# Altium footprint library ICs And Semiconductors THD.PcbLib: 507 footprints (part 14 of 32)
Each footprint in its own frame and in the unit in brackets; x right, y up, seen from the top. Pads: shape width x height; smd on the part's side, far side on the other; paste and mask are expansions set on the pad; w line width, h text height; cw(c..) or ccw(c..) is an arc to the next point about the centre after c.
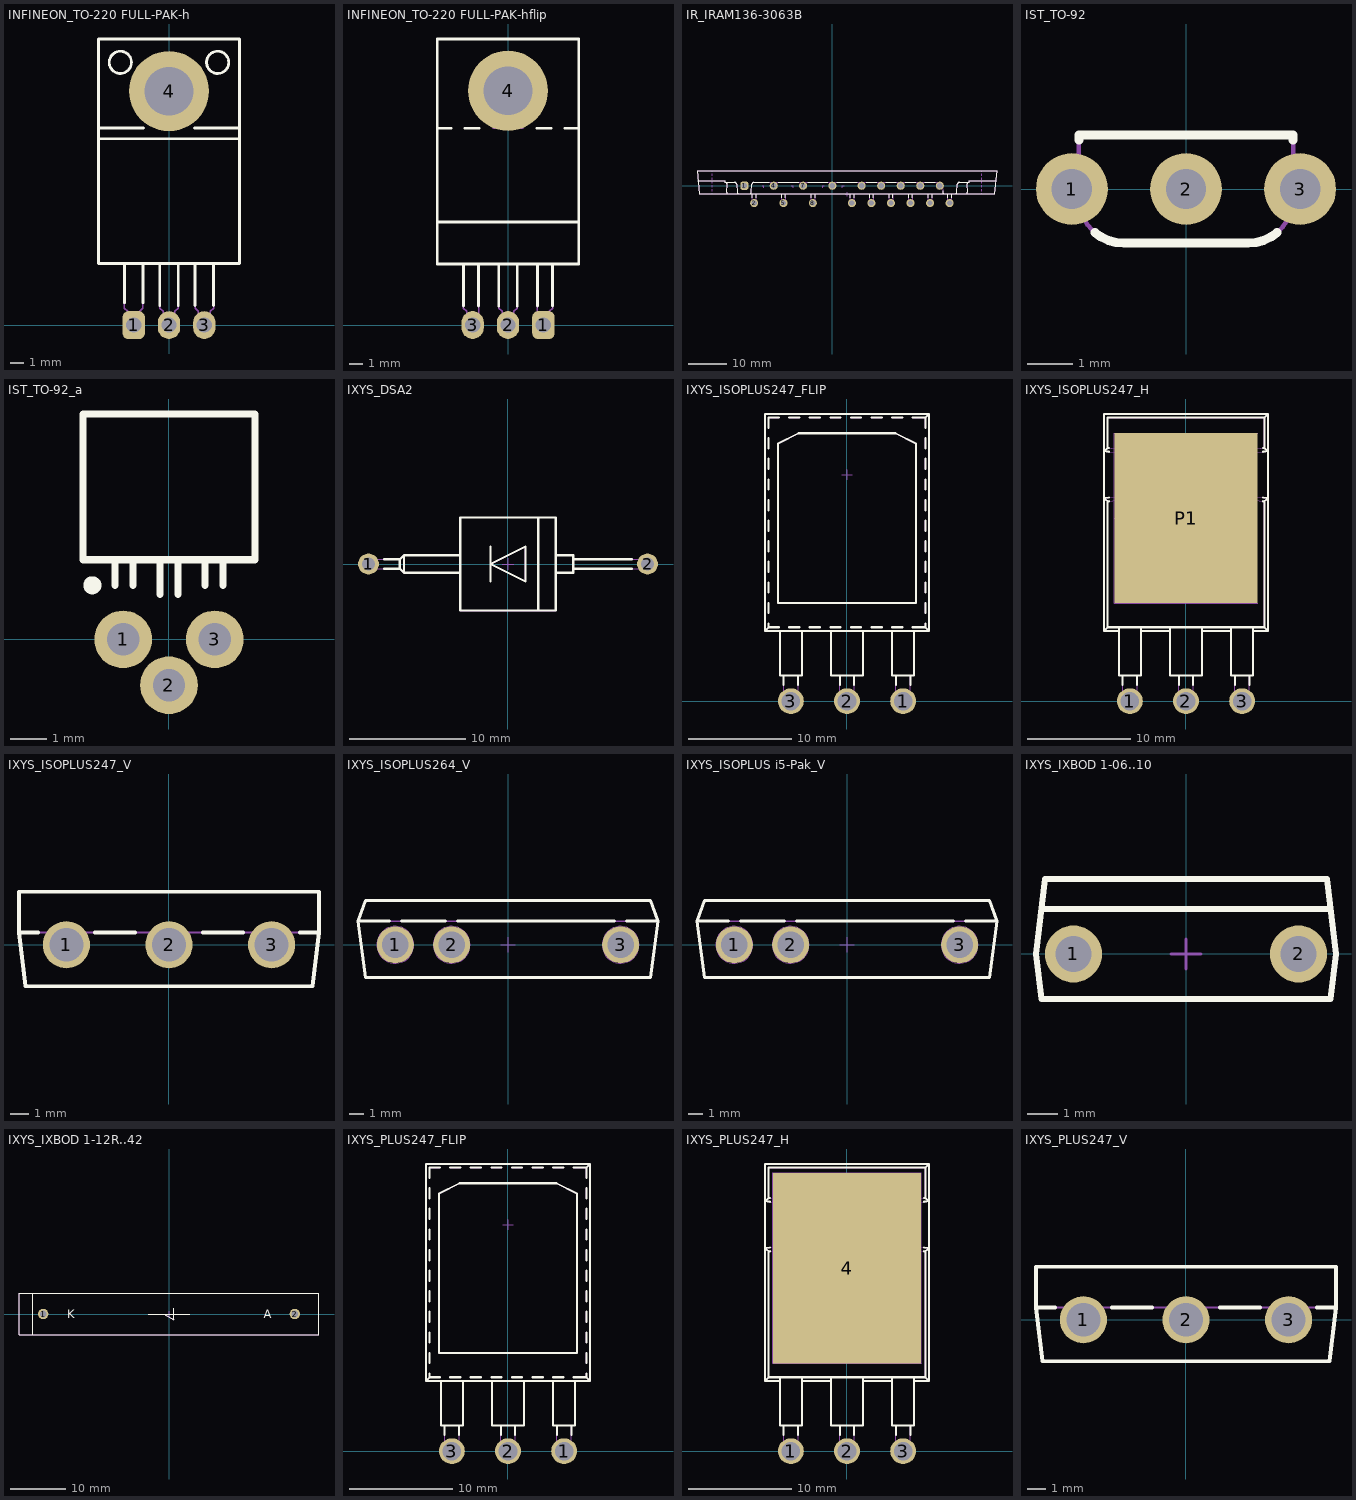
[diagram p13: the footprints below, top view; thin cyan lines are the x and y axes]

## INFINEON_TO-220 FULL-PAK-h [mm] "TO-220 3-Terminal Outline INFINEON/INTERNATIONAL RECTIFIER Full-Pak Package - Horizontal Mount"
height 4.83
pads (4):
  rrect50% 1.6x2 hole 1.1: 1(-2.54,0)
  oval 1.6x2 hole 1.1: 2(0,0) 3(2.54,0)
  round 5.75 hole 3.5: 4(0,16.828)
Top Overlay:
  circle w0.2: c3.5,18.9 r0.8
  circle w0.2: c-3.5,18.9 r0.8
  lines w0.2: -5.08,13.407 5.08,13.407 ; -5.08,14.172 -1.827,14.172 ; -3.205,1.6 -3.205,4.43 ; -1.875,1.6 -1.875,4.43 ; -0.665,1.4 -0.665,4.43 ; 0.665,1.4 0.665,4.43 ; 1.827,14.172 5.08,14.172 ; 1.875,1.4 1.875,4.43 ; 3.205,1.4 3.205,4.43 ; -5.08,4.43 -5.08,20.58 5.08,20.58 5.08,4.43 -5.08,4.43
Notvisible:
  lines w0.1: -3.04,0 -2.54,0 ; -2.54,-0.5 -2.54,0 ; -2.54,0.5 -2.54,0 ; -2.04,0 -2.54,0 ; -0.5,0 0,0 ; 0,-0.5 0,0 ; 0,0.5 0,0 ; 0.5,0 0,0 ; 2.04,0 2.54,0 ; 2.54,-0.5 2.54,0 ; 2.54,0.5 2.54,0 ; 3.04,0 2.54,0
Mechanical 14:
  circle w0.1: c0,16.828 r2
  circle w0.1: c3.5,18.9 r0.8
  circle w0.1: c-3.5,18.9 r0.8
  circle w0.1: c0,16.83 r1.6
  lines w0.1: -5.08,13.407 5.08,13.407 ; -5.08,14.172 -1.827,14.172 ; -3.205,4.43 -3.205,1.22 -2.965,0.98 -2.965,-0.315 -2.115,-0.315 -2.115,0.98 -1.875,1.22 -1.875,4.43 ; -0.665,4.43 -0.665,1.22 -0.425,0.98 -0.425,-0.315 0.425,-0.315 0.425,0.98 0.665,1.22 0.665,4.43 ; 1.827,14.172 5.08,14.172 ; 1.875,4.43 1.875,1.22 2.115,0.98 2.115,-0.315 2.965,-0.315 2.965,0.98 3.205,1.22 3.205,4.43 ; -5.08,4.43 -5.08,20.58 5.08,20.58 5.08,4.43 -5.08,4.43
3D body "IR_TO-220 FULL-PAK-h.stp": height 4.85, standoff -3.6, extent -5.08,-0.315 5.08,20.58

## INFINEON_TO-220 FULL-PAK-hflip [mm] "TO-220 3-Terminal Outline INFINEON/INTERNATIONAL RECTIFIER Full-Pak Package - Flipped Horizontal Mount"
height 4.83
pads (4):
  rrect50% 1.6x2 hole 1.1: 1(2.54,0)
  oval 1.6x2 hole 1.1: 2(0,0) 3(-2.54,0)
  round 5.75 hole 3.5: 4(0,16.828)
Top Overlay:
  lines w0.2: -5.08,7.395 5.08,7.395 ; -5.08,14.137 -4.08,14.137 ; -3.205,1.365 -3.205,4.395 ; -3.08,14.137 -2.08,14.137 ; -2.115,1.365 -2.115,4.395 ; -0.665,1.365 -0.665,4.395 ; 0.665,1.365 0.665,4.395 ; 2.08,14.137 3.08,14.137 ; 2.115,1.365 2.115,4.395 ; 3.205,1.365 3.205,4.395 ; 4.08,14.137 5.08,14.137 ; -5.08,4.395 5.08,4.395 5.08,20.545 -5.08,20.545 -5.08,4.395
Notvisible:
  lines w0.1: -3.04,0 -2.54,0 ; -2.54,-0.5 -2.54,0 ; -2.54,0.5 -2.54,0 ; -2.04,0 -2.54,0 ; -0.5,0 0,0 ; -0.5,16.75 0,16.75 ; 0,-0.5 0,0 ; 0,0.5 0,0 ; 0,16.25 0,16.75 ; 0,17.25 0,16.75 ; 0.5,0 0,0 ; 0.5,16.75 0,16.75 ; 2.04,0 2.54,0 ; 2.54,-0.5 2.54,0 ; 2.54,0.5 2.54,0 ; 3.04,0 2.54,0
Mechanical 14:
  circle w0.1: c0,16.795 r1.6
  lines w0.1: -5.08,7.395 5.08,7.395 ; -5.08,14.137 -4.08,14.137 ; -3.205,4.395 -3.205,1.22 -2.965,0.98 -2.965,-0.315 -2.115,-0.315 -2.115,4.395 ; -3.08,14.137 -2.08,14.137 ; -1.08,14.137 1.08,14.137 ; -0.665,4.395 -0.665,1.22 -0.425,0.98 -0.425,-0.315 0.425,-0.315 0.425,0.98 0.665,1.22 0.665,4.395 ; 2.08,14.137 3.08,14.137 ; 2.115,4.395 2.115,-0.315 2.965,-0.315 2.965,0.98 3.205,1.22 3.205,4.395 ; 4.08,14.137 5.08,14.137 ; -5.08,4.395 -5.08,20.545 5.08,20.545 5.08,4.395 -5.08,4.395
3D body "INFINEON_TO-220 FULL-PAK-hflip.stp": height 4.85, standoff -3.6, extent -5.08,-0.315 5.08,20.545

## IR_IRAM136-3063B [mm] "International Rectifier SIP-3 Package Outline"
height 34.1
pads (18):
  rrect50% 2.1x2.1 hole 1.4: 1(-22.86,0)
  round 2.1 hole 1.4: 2(-20.32,-4.5) 4(-15.24,0) 5(-12.7,-4.5) 7(-7.62,0) 8(-5.08,-4.5) 10(0,0) 12(5.08,-4.5) 13(7.62,0) 14(10.16,-4.5) 15(12.7,0) 16(15.24,-4.5) 17(17.78,0) 18(20.32,-4.5) 19(22.86,0) 20(25.4,-4.5) 21(27.94,0) 22(30.48,-4.5)
Top Overlay:
  lines w0.2: -34.962,1.25 -27.963,1.25 -27.928,0.85 -25.386,0.85 cw(c-25.386,0.349) -24.887,0.392 -24.704,-1.695 ccw(c-24.207,-1.651) -24.207,-2.15 -21.573,-2.15 ccw(c-21.573,-1.65) -21.075,-1.694 -20.892,0.394 cw(c-20.394,0.35) -20.394,0.85 -16.415,0.85 ; -27.727,0.85 cw(c-27.788,0.448) -27.385,0.394 -27.497,-1.694 ccw(c-26.946,-1.754) -27.334,-2.15 ; -20.77,-3.122 -20.77,-2.15 ; -19.87,-3.122 -19.87,-2.15 ; -14.065,0.85 -8.795,0.85 ; -13.15,-3.122 -13.15,-2.15 ; -12.25,-3.122 -12.25,-2.15 ; -6.445,0.85 -1.175,0.85 ; -5.53,-3.122 -5.53,-2.15 ; -4.63,-3.122 -4.63,-2.15 ; 1.175,0.85 6.445,0.85 ; 4.63,-3.122 4.63,-2.15 ; 5.53,-3.122 5.53,-2.15 ; 8.795,0.85 11.525,0.85 ; 9.71,-3.122 9.71,-2.15 ; 10.61,-3.122 10.61,-2.15 ; 13.875,0.85 16.605,0.85 ; 14.79,-3.122 14.79,-2.15 ; 15.69,-3.122 15.69,-2.15 ; 18.955,0.85 21.685,0.85 ; 19.87,-3.122 19.87,-2.15 ; 20.77,-3.122 20.77,-2.15 ; 24.035,0.85 26.765,0.85 ; 24.95,-3.122 24.95,-2.15 ; 25.85,-3.122 25.85,-2.15 ; 28.657,-1.26 28.695,-1.694 ccw(c29.193,-1.65) 29.193,-2.15 ; 30.03,-3.122 30.03,-2.15 ; 30.93,-3.122 30.93,-2.15 ; 31.827,-2.15 ccw(c31.827,-1.65) 32.325,-1.694 32.508,0.394 cw(c33.006,0.35) 33.006,0.85 35.548,0.85 35.583,1.25 42.583,1.25 ; 34.954,-2.15 ccw(c34.341,-1.673) 35.117,-1.694 35.005,0.394 cw(c35.538,0.394) 35.262,0.85 ; -35.19,3.85 42.81,3.85 42.285,-2.15 -34.665,-2.15 -35.19,3.85
Notvisible:
  lines w0.1: -31.19,-2.15 -31.19,-1.9 ; -31.19,-1.4 -31.19,-0.9 ; -31.19,-0.4 -31.19,0.1 ; -31.19,0.6 -31.19,1.1 ; -31.19,1.6 -31.19,2.1 ; -31.19,2.6 -31.19,3.1 ; -31.19,3.6 -31.19,3.85 ; -23.36,0 -22.86,0 ; -22.86,-0.5 -22.86,0 ; -22.86,0.5 -22.86,0 ; -22.36,0 -22.86,0 ; -20.82,-4.5 -20.32,-4.5 ; -20.32,-5 -20.32,-4.5 ; -20.32,-4 -20.32,-4.5 ; -19.82,-4.5 -20.32,-4.5 ; -18.28,0 -17.78,0 -17.78,-0.5 ; -15.74,0 -15.24,0 ; -15.24,-0.5 -15.24,0 ; -15.24,0.5 -15.24,0 ; -14.74,0 -15.24,0 ; -13.2,-4.5 -12.7,-4.5 ; -12.7,-5 -12.7,-4.5 ; -12.7,-4 -12.7,-4.5 ; -12.2,-4.5 -12.7,-4.5 ; -10.66,0 -10.16,0 -10.16,-0.5 ; -8.12,0 -7.62,0 ; -7.62,-0.5 -7.62,0 ; -7.62,0.5 -7.62,0 ; -7.12,0 -7.62,0 ; -5.58,-4.5 -5.08,-4.5 ; -5.08,-5 -5.08,-4.5 ; -5.08,-4 -5.08,-4.5 ; -4.58,-4.5 -5.08,-4.5 ; -2.54,-0.5 -2.54,0 -2.04,0 ; -0.5,0 0,0 ; 0,-0.5 0,0 ; 0,0.5 0,0 ; 0.5,0 0,0 ; 2.54,-0.5 2.54,0 3.04,0 ; 3.31,-2.25 3.81,-2.25 ; 3.81,-2.75 3.81,-2.25 ; 3.81,-1.75 3.81,-2.25 ; 4.31,-2.25 3.81,-2.25 ; 4.58,-4.5 5.08,-4.5 ; 5.08,-5 5.08,-4.5 ; 5.08,-4 5.08,-4.5 ; 5.58,-4.5 5.08,-4.5 ; 7.12,0 7.62,0 ; 7.62,-0.5 7.62,0 ; 7.62,0.5 7.62,0 ; 8.12,0 7.62,0 ; 9.66,-4.5 10.16,-4.5 ; 10.16,-5 10.16,-4.5 ; 10.16,-4 10.16,-4.5 ; 10.66,-4.5 10.16,-4.5 ; 12.2,0 12.7,0 ; 12.7,-0.5 12.7,0 ; 12.7,0.5 12.7,0 ; 13.2,0 12.7,0 ; 14.74,-4.5 15.24,-4.5 ; 15.24,-5 15.24,-4.5 ; 15.24,-4 15.24,-4.5 ; 15.74,-4.5 15.24,-4.5 ; 17.28,0 17.78,0 ; 17.78,-0.5 17.78,0 ; 17.78,0.5 17.78,0 ; 18.28,0 17.78,0 ; 19.82,-4.5 20.32,-4.5 ; 20.32,-5 20.32,-4.5 ; 20.32,-4 20.32,-4.5 ; 20.82,-4.5 20.32,-4.5 ; 22.36,0 22.86,0 ; 22.86,-0.5 22.86,0 ; 22.86,0.5 22.86,0 ; 23.36,0 22.86,0 ; 24.9,-4.5 25.4,-4.5 ; 25.4,-5 25.4,-4.5 ; 25.4,-4 25.4,-4.5 ; 25.9,-4.5 25.4,-4.5 ; 27.44,0 27.94,0 ; 27.94,-0.5 27.94,0 ; 27.94,0.5 27.94,0 ; 28.44,0 27.94,0 ; 29.98,-4.5 30.48,-4.5 ; 30.48,-5 30.48,-4.5 ; 30.48,-4 30.48,-4.5 ; 30.98,-4.5 30.48,-4.5 ; 38.81,-2.15 38.81,-1.9 ; 38.81,-1.4 38.81,-0.9 ; 38.81,-0.4 38.81,0.1 ; 38.81,0.6 38.81,1.1 ; 38.81,1.6 38.81,2.1 ; 38.81,2.6 38.81,3.1 ; 38.81,3.6 38.81,3.85
Mechanical 14:
  lines w0.1: -34.962,1.25 -27.963,1.25 -27.928,0.85 -25.386,0.85 cw(c-25.386,0.349) -24.887,0.392 -24.704,-1.695 ccw(c-24.207,-1.651) -24.207,-2.15 -21.573,-2.15 ccw(c-21.573,-1.65) -21.075,-1.694 -20.892,0.394 cw(c-20.394,0.35) -20.394,0.85 28.014,0.85 cw(c28.014,0.35) 28.512,0.394 28.695,-1.694 ccw(c29.193,-1.65) 29.193,-2.15 ; -27.727,0.85 cw(c-27.788,0.448) -27.385,0.394 -27.497,-1.694 ccw(c-26.946,-1.754) -27.334,-2.15 ; -20.77,-2.15 -20.77,-4.85 -19.87,-4.85 -19.87,-2.15 ; -13.15,-2.15 -13.15,-4.85 -12.25,-4.85 -12.25,-2.15 ; -5.53,-2.15 -5.53,-4.85 -4.63,-4.85 -4.63,-2.15 ; 4.63,-2.15 4.63,-4.85 5.53,-4.85 5.53,-2.15 ; 9.71,-2.15 9.71,-4.85 10.61,-4.85 10.61,-2.15 ; 14.79,-2.15 14.79,-4.85 15.69,-4.85 15.69,-2.15 ; 19.87,-2.15 19.87,-4.85 20.77,-4.85 20.77,-2.15 ; 24.95,-2.15 24.95,-4.85 25.85,-4.85 25.85,-2.15 ; 30.03,-2.15 30.03,-4.85 30.93,-4.85 30.93,-2.15 ; 31.827,-2.15 ccw(c31.827,-1.65) 32.325,-1.694 32.508,0.394 cw(c33.006,0.35) 33.006,0.85 35.548,0.85 35.583,1.25 42.583,1.25 ; 34.954,-2.15 ccw(c34.341,-1.673) 35.117,-1.694 35.005,0.394 cw(c35.538,0.394) 35.262,0.85 ; -35.19,3.85 42.81,3.85 42.285,-2.15 -34.665,-2.15 -35.19,3.85
3D body "IR_IRAM136-3063B.stp": height 35.1, standoff -3.3, extent -35.19,-4.85 42.81,3.85

## IST_TO-92 [mm] "TO-92, Pitch 2.54mm, Flat Index, 3 In-Line, Bent Leads, Body 4.57 x 2.285mm"
height 8
pads (3):
  round 1.6 hole 0.9: 1(-2.54,0) 2(0,0) 3(2.54,0)
Top Overlay:
  lines w0.2: -2.385,1.089 -2.385,1.205 2.385,1.205 2.385,1.089 ; -2.026,-0.973 ccw(c-1.385,-0.205) -1.385,-1.205 1.385,-1.205 ccw(c1.385,-0.205) 2.026,-0.973
Notvisible:
  lines w0.1: -3.04,0 -2.54,0 ; -2.54,-0.5 -2.54,0 ; -2.54,0.5 -2.54,0 ; -2.04,0 -2.54,0 ; -0.5,0 0,0 ; 0,-0.5 0,0 ; 0,0.5 0,0 ; 0.5,0 0,0 ; 2.04,0 2.54,0 ; 2.54,-0.5 2.54,0 ; 2.54,0.5 2.54,0 ; 3.04,0 2.54,0
Mechanical 14:
  lines w0.1: -2.385,-0.205 ccw(c-1.385,-0.205) -1.385,-1.205 1.385,-1.205 ccw(c1.385,-0.205) 2.385,-0.205 2.385,1.205 -2.385,1.205 -2.385,-0.205
3D body "IST_TO92.stp": height 8.01, standoff -3.2, extent -2.787,-1.205 2.788,1.205

## IST_TO-92_a [mm] "TO-92, Pitch 2.54mm, Flat Index, 3 In-Line, Bent Leads, Body 4.57 x 2.285mm - Bent on the PCB"
height 2.14
pads (3):
  round 1.6 hole 0.9: 1(-1.27,0) 2(0,-1.27) 3(1.27,0)
Top Overlay:
  circle w0.25: c-2.125,1.5 r0.125
  lines w0.2: -2.385,6.215 -2.385,2.205 ; -2.385,6.25 2.385,6.25 ; -1.498,1.5 -1.498,2.205 ; -1.002,1.5 -1.002,2.205 ; -0.247,1.25 -0.247,2.205 ; 0.248,1.25 0.248,2.205 ; 1.002,1.5 1.002,2.205 ; 1.498,1.5 1.498,2.205 ; 2.385,6.215 2.385,2.205 ; -2.385,2.205 2.385,2.205 ; -2.385,2.205 2.385,2.205
Notvisible:
  lines w0.1: -1.77,0 -1.27,0 ; -1.27,-0.5 -1.27,0 ; -1.27,0.5 -1.27,0 ; -0.77,0 -1.27,0 ; -0.5,-1.27 0,-1.27 ; 0,-1.77 0,-1.27 ; 0,-0.77 0,-1.27 ; 0.5,-1.27 0,-1.27 ; 0.77,0 1.27,0 ; 1.27,-0.5 1.27,0 ; 1.27,0.5 1.27,0 ; 1.77,0 1.27,0
Mechanical 14:
  lines w0.1: -1.498,1.5 -1.498,2.205 ; -1.002,1.5 -1.002,2.205 ; -0.248,1.25 -0.248,2.205 ; 0.248,1.25 0.248,2.205 ; 1.002,1.5 1.002,2.205 ; 1.498,1.5 1.498,2.205 ; -2.385,6.215 2.385,6.215 2.385,2.205 -2.385,2.205 -2.385,6.215 ; -2.385,6.215 -2.385,6.215
3D body "IST_TO92_a.stp": height 2.41, standoff -2.9, extent -2.385,-1.517 2.385,6.215

## IXYS_DSA2 [mm] "Diode, Axial; Lead Spacing 24mm, Lead Dia. 0.8mm, Body Length 8.2mm, Body Dia. 8mm, DSA2 IXYS Case"
height 8
pads (2):
  round 1.8 hole 1.1: 1(-12,0) 2(12,0)
Top Overlay:
  lines w0.2: -10.658,-0.4 -9.3,-0.4 ; -10.658,0.4 -9.3,0.4 ; -4.1,-0.75 -8.95,-0.75 ; -4.1,0.75 -8.95,0.75 ; -1.5,-1.5 -1.5,1.5 ; 2.6,-4 2.6,4 ; 4.1,-0.75 5.6,-0.75 5.6,0.75 4.1,0.75 ; 5.6,-0.4 10.658,-0.4 ; 5.6,0.4 10.658,0.4 ; -9.3,-0.4 -8.95,-0.75 ; -9.3,-0.4 -9.3,0.4 ; -9.3,0.4 -8.95,0.75 ; -8.95,-0.75 -8.95,0.75 ; -4.1,-4 -4.1,4 4.1,4 4.1,-4 -4.1,-4 ; -1.5,0 1.5,1.5 1.5,-1.5 -1.5,0
Notvisible:
  lines w0.1: -12.5,0 -12,0 ; -12,-0.5 -12,0 ; -12,0.5 -12,0 ; -11.5,0 -12,0 ; -0.5,0 0,0 ; 0,-0.5 0,0 ; 0,0.5 0,0 ; 0.5,0 0,0 ; 11.5,0 12,0 ; 12,-0.5 12,0 ; 12,0.5 12,0 ; 12.5,0 12,0
Mechanical 14:
  lines w0.1: -4.1,-0.75 -8.95,-0.75 ; -4.1,0.75 -8.95,0.75 ; -1.5,-1.5 -1.5,1.5 ; 2.6,-4 2.6,4 ; 4.1,-0.75 5.6,-0.75 5.6,0.75 4.1,0.75 ; 5.6,-0.4 12,-0.4 ccw(c12,0) 12,0.4 5.6,0.4 ; -9.3,-0.4 -8.95,-0.75 ; -9.3,-0.4 -12,-0.4 cw(c-12,0) -12,0.4 -9.3,0.4 ; -9.3,-0.4 -9.3,0.4 ; -9.3,0.4 -8.95,0.75 ; -8.95,-0.75 -8.95,0.75 ; -4.1,-4 -4.1,4 4.1,4 4.1,-4 -4.1,-4 ; -1.5,0 1.5,1.5 1.5,-1.5 -1.5,0
3D body "IXYS_DSA2.stp": height 8, standoff -3.6, extent -12.399,-3.983 12.399,3.983

## IXYS_ISOPLUS247_FLIP [mm] "IXYS ISOPLUS247 Case, Lead spacing 5.45mm Body 21.07mm X 15.94mm - Flipped Horizontal Mount"
height 5.21
pads (3):
  round 2.5 hole 1.8: 1(5.45,0) 2(0,0) 3(-5.45,0)
Top Overlay:
  lines w0.2: -7.62,7.545 -7.62,7.175 ; -7.62,8.545 -7.62,9.545 ; -7.62,10.545 -7.62,11.545 ; -7.62,12.545 -7.62,13.545 ; -7.62,14.545 -7.62,15.545 ; -7.62,16.545 -7.62,17.545 ; -7.62,18.545 -7.62,19.545 ; -7.62,20.545 -7.62,21.545 ; -7.62,22.545 -7.62,23.545 ; -7.62,24.545 -7.62,25.545 ; -7.62,26.545 -7.62,27.545 -6.62,27.545 ; -6.62,7.175 -7.62,7.175 ; -6.515,6.825 -6.515,2.505 -4.385,2.505 -4.385,6.825 ; -6.15,1.549 -6.15,2.505 ; -5.62,7.175 -4.62,7.175 ; -5.62,27.545 -4.62,27.545 ; -4.75,1.549 -4.75,2.505 ; -3.62,7.175 -2.62,7.175 ; -3.62,27.545 -2.62,27.545 ; -1.62,7.175 -0.62,7.175 ; -1.62,27.545 -0.62,27.545 ; -1.56,6.825 -1.56,2.505 1.56,2.505 1.56,6.825 ; -0.7,1.549 -0.7,2.505 ; 0.38,7.175 1.38,7.175 ; 0.38,27.545 1.38,27.545 ; 0.7,1.549 0.7,2.505 ; 2.38,7.175 3.38,7.175 ; 2.38,27.545 3.38,27.545 ; 4.38,7.175 5.38,7.175 ; 4.38,27.545 5.38,27.545 ; 4.385,6.825 4.385,2.505 6.515,2.505 6.515,6.825 ; 4.75,1.549 4.75,2.505 ; 6.15,1.549 6.15,2.505 ; 6.38,7.175 7.62,7.175 ; 6.38,27.545 7.62,27.545 ; 7.62,7.545 7.62,7.175 ; 7.62,8.545 7.62,9.545 ; 7.62,10.545 7.62,11.545 ; 7.62,12.545 7.62,13.545 ; 7.62,14.545 7.62,15.545 ; 7.62,16.545 7.62,17.545 ; 7.62,18.545 7.62,19.545 ; 7.62,20.545 7.62,21.545 ; 7.62,22.545 7.62,23.545 ; 7.62,24.545 7.62,25.545 ; 7.62,26.545 7.62,27.545 ; -7.97,6.825 -7.62,7.175 ; -7.97,6.825 -7.97,27.895 7.97,27.895 ; -7.97,6.825 7.97,6.825 ; 7.62,7.175 7.97,6.825 ; 7.62,27.545 7.97,27.895 ; 7.97,6.825 7.97,27.895 ; -6.7,9.525 6.7,9.525 6.7,25.025 4.7,26.025 -4.7,26.025 -6.7,25.025 -6.7,9.525
Notvisible:
  lines w0.1: -5.95,0 -5.45,0 ; -5.45,-0.5 -5.45,0 ; -5.45,0.5 -5.45,0 ; -4.95,0 -5.45,0 ; -0.5,0 0,0 ; -0.5,22 0,22 ; 0,-0.5 0,0 ; 0,0.5 0,0 ; 0,21.5 0,22 ; 0,22.5 0,22 ; 0.5,0 0,0 ; 0.5,22 0,22 ; 4.95,0 5.45,0 ; 5.45,-0.5 5.45,0 ; 5.45,0.5 5.45,0 ; 5.95,0 5.45,0
Mechanical 14:
  lines w0.1: -7.62,7.545 -7.62,7.175 ; -7.62,8.545 -7.62,9.545 ; -7.62,10.545 -7.62,11.545 ; -7.62,12.545 -7.62,13.545 ; -7.62,14.545 -7.62,15.545 ; -7.62,16.545 -7.62,17.545 ; -7.62,18.545 -7.62,19.545 ; -7.62,20.545 -7.62,21.545 ; -7.62,22.545 -7.62,23.545 ; -7.62,24.545 -7.62,25.545 ; -7.62,26.545 -7.62,27.545 -6.62,27.545 ; -6.62,7.175 -7.62,7.175 ; -6.515,6.825 -6.515,2.505 -4.385,2.505 -4.385,6.825 ; -6.15,2.505 -6.15,-0.4 -4.75,-0.4 -4.75,2.505 ; -5.62,7.175 -4.62,7.175 ; -5.62,27.545 -4.62,27.545 ; -3.62,7.175 -2.62,7.175 ; -3.62,27.545 -2.62,27.545 ; -1.62,7.175 -0.62,7.175 ; -1.62,27.545 -0.62,27.545 ; -1.56,6.825 -1.56,2.505 1.56,2.505 1.56,6.825 ; -0.7,2.505 -0.7,-0.4 0.7,-0.4 0.7,2.505 ; 0.38,7.175 1.38,7.175 ; 0.38,27.545 1.38,27.545 ; 2.38,7.175 3.38,7.175 ; 2.38,27.545 3.38,27.545 ; 4.38,7.175 5.38,7.175 ; 4.38,27.545 5.38,27.545 ; 4.385,6.825 4.385,2.505 6.515,2.505 6.515,6.825 ; 4.75,2.505 4.75,-0.4 6.15,-0.4 6.15,2.505 ; 6.38,7.175 7.62,7.175 ; 6.38,27.545 7.62,27.545 ; 7.62,7.545 7.62,7.175 ; 7.62,8.545 7.62,9.545 ; 7.62,10.545 7.62,11.545 ; 7.62,12.545 7.62,13.545 ; 7.62,14.545 7.62,15.545 ; 7.62,16.545 7.62,17.545 ; 7.62,18.545 7.62,19.545 ; 7.62,20.545 7.62,21.545 ; 7.62,22.545 7.62,23.545 ; 7.62,24.545 7.62,25.545 ; 7.62,26.545 7.62,27.545 ; -7.97,6.825 7.97,6.825 ; -7.97,6.825 -7.62,7.175 ; -7.97,6.825 -7.97,27.895 7.97,27.895 ; 7.62,7.175 7.97,6.825 ; 7.62,27.545 7.97,27.895 ; 7.97,6.825 7.97,27.895 ; -6.7,9.525 6.7,9.525 6.7,25.025 4.7,26.025 -4.7,26.025 -6.7,25.025 -6.7,9.525
3D body "IXYS_PLUS247_FLIP.stp": height 5.02, standoff -4.21, extent -7.97,-0.4 7.97,27.895

## IXYS_ISOPLUS247_H [mm] "IXYS ISOPLUS247 Case, Lead spacing 5.45mm Body 21.07mm X 15.94mm - Horizontal Mount"
height 5.21
pads (4):
  round 2.5 hole 1.8: 1(-5.45,0) 2(0,0) 3(5.45,0)
  rect 13.9x16.5 smd paste-9.25: P1(0,17.775)
Top Overlay:
  lines w0.2: -7.5,19.418 -7.62,19.403 ; -7.5,19.77 -7.97,19.713 -7.62,19.403 ; -7.5,24.23 -7.97,24.288 -7.62,24.597 ; -7.5,24.582 -7.62,24.597 ; -6.515,6.825 -7.97,6.825 ; -6.515,7.175 -6.515,2.505 -4.385,2.505 -4.385,7.175 ; -6.15,1.549 -6.15,2.505 ; -4.75,1.549 -4.75,2.505 ; -4.385,6.825 -1.56,6.825 ; -1.56,7.175 -1.56,2.505 1.56,2.505 1.56,7.175 ; -0.7,1.549 -0.7,2.505 ; 0.7,1.549 0.7,2.505 ; 1.56,6.825 4.385,6.825 ; 4.385,7.175 4.385,2.505 6.515,2.505 6.515,7.175 ; 4.75,1.549 4.75,2.505 ; 6.15,1.549 6.15,2.505 ; 6.515,6.825 7.97,6.825 ; 7.5,19.418 7.62,19.403 ; 7.5,19.77 7.97,19.713 7.62,19.403 ; 7.5,24.23 7.97,24.288 7.62,24.597 ; 7.5,24.582 7.62,24.597 ; -7.97,6.825 -7.97,27.895 7.97,27.895 ; -7.97,6.825 -7.62,7.175 ; -7.62,7.175 7.62,7.175 ; -7.62,7.175 -7.62,19.403 ; -7.62,24.597 -7.62,27.545 7.62,27.545 ; 7.62,7.175 7.97,6.825 ; 7.62,7.175 7.62,19.403 ; 7.62,24.597 7.62,27.545 ; 7.62,27.545 7.97,27.895 ; 7.97,6.825 7.97,27.895
Notvisible:
  lines w0.1: -6.95,17.775 0,17.775 0,9.525 ; -5.95,0 -5.45,0 ; -5.45,-0.5 -5.45,0 ; -5.45,0.5 -5.45,0 ; -4.95,0 -5.45,0 ; -0.5,0 0,0 ; -0.5,22 0,22 ; 0,-0.5 0,0 ; 0,0.5 0,0 ; 0,21.5 0,22 ; 0,22.5 0,22 ; 0.5,0 0,0 ; 0.5,22 0,22 ; 4.95,0 5.45,0 ; 5.45,-0.5 5.45,0 ; 5.45,0.5 5.45,0 ; 5.95,0 5.45,0 ; 6.95,9.525 -6.95,9.525 -6.95,26.025 6.95,26.025
Mechanical 14:
  lines w0.1: -6.515,6.825 -7.97,6.825 ; -6.515,7.175 -6.515,2.505 -4.385,2.505 -4.385,7.175 ; -6.15,2.505 -6.15,-0.4 -4.75,-0.4 -4.75,2.505 ; -4.385,6.825 -1.56,6.825 ; -1.56,7.175 -1.56,2.505 1.56,2.505 1.56,7.175 ; -0.7,2.505 -0.7,-0.4 0.7,-0.4 0.7,2.505 ; 1.56,6.825 4.385,6.825 ; 4.385,7.175 4.385,2.505 6.515,2.505 6.515,7.175 ; 4.75,2.505 4.75,-0.4 6.15,-0.4 6.15,2.505 ; 6.515,6.825 7.97,6.825 ; -7.97,6.825 -7.97,27.895 7.97,27.895 ; -7.97,6.825 -7.62,7.175 ; -7.62,7.175 7.62,7.175 ; -7.62,7.175 -7.62,19.403 ; -7.62,19.403 -6.12,19.587 ; -7.62,19.403 -7.97,19.713 -6.47,19.897 ; -7.62,24.597 -7.62,27.545 7.62,27.545 ; -7.62,24.597 -7.97,24.288 -6.47,24.103 ; -7.62,24.597 -6.12,24.413 ; -6.47,19.897 -6.47,24.103 ; -6.47,19.897 -6.12,19.587 ; -6.47,24.103 -6.12,24.413 ; -6.12,19.587 -6.12,24.413 ; 6.12,19.587 7.62,19.403 ; 6.12,19.587 6.47,19.897 ; 6.12,19.587 6.12,24.413 ; 6.12,24.413 6.47,24.103 ; 6.12,24.413 7.62,24.597 ; 6.47,19.897 6.47,24.103 ; 6.47,19.897 7.97,19.713 7.62,19.403 ; 6.47,24.103 7.97,24.288 7.62,24.597 ; 7.62,7.175 7.97,6.825 ; 7.62,7.175 7.62,19.403 ; 7.62,24.597 7.62,27.545 ; 7.62,27.545 7.97,27.895 ; 7.97,6.825 7.97,27.895
3D body "IXYS_PLUS247_H.stp": height 5.02, standoff -3.6, extent -7.97,-0.4 7.97,27.895

## IXYS_ISOPLUS247_V [mm] "IXYS ISOPLUS247 Case, Lead spacing 5.45mm Body 21.07mm X 15.94mm - Vertical Mount"
height 25.66
pads (3):
  round 2.5 hole 1.8: 1(-5.45,0) 2(0,0) 3(5.45,0)
Top Overlay:
  lines w0.2: -6.964,0.655 -7.97,0.655 ; -3.936,0.655 -1.795,0.655 ; 1.795,0.655 3.936,0.655 ; 6.964,0.655 7.97,0.655 ; -7.97,0.655 -7.62,-2.205 7.623,-2.205 7.97,0.655 ; -7.97,0.655 -7.97,2.815 7.97,2.815 7.97,0.655
Notvisible:
  lines w0.1: -5.95,0 -5.45,0 ; -5.45,-0.5 -5.45,0 ; -5.45,0.5 -5.45,0 ; -4.95,0 -5.45,0 ; -0.5,0 0,0 ; 0,-0.5 0,0 ; 0,0.5 0,0 ; 0.5,0 0,0 ; 4.95,0 5.45,0 ; 5.45,-0.5 5.45,0 ; 5.45,0.5 5.45,0 ; 5.95,0 5.45,0
Mechanical 14:
  lines w0.1: 7.62,-2.205 7.97,0.655 ; 7.623,-2.205 -7.62,-2.205 -7.97,0.655 ; -7.97,0.655 -7.97,2.815 7.97,2.815 7.97,0.655 ; -7.97,0.655 7.97,0.655
3D body "IXYS_PLUS247_V.stp": height 25.4, standoff -4.95, extent -7.97,-2.205 7.97,2.815

## IXYS_ISOPLUS264_V [mm] "IXYS ISOPLUS264 Case, Lead spacing 3.81mm Body 20.29mm X 5.21mm - Vertical Mount"
height 30
pads (3):
  round 2.5 hole 1.8: 1(-7.62,0) 2(-3.81,0) 3(7.62,0)
Top Overlay:
  lines w0.2: -8.023,1.6 -10.145,1.6 ; -7.217,1.6 -4.213,1.6 ; -3.407,1.6 7.217,1.6 ; 8.023,1.6 10.145,1.6 ; -10.145,1.6 -9.645,-2.21 9.645,-2.21 10.145,1.6 ; -10.145,1.6 -9.645,3 9.645,3 10.145,1.6
Notvisible:
  circle w0.05: c-7.62,0 r0.9
  circle w0.05: c-7.62,0 r1.25
  circle w0.05: c-3.81,0 r0.9
  circle w0.05: c-3.81,0 r1.25
  circle w0.05: c7.62,0 r0.9
  circle w0.05: c7.62,0 r1.25
  lines w0.05: -8.12,0 -7.62,0 ; -7.62,-0.5 -7.62,0 ; -7.62,0.5 -7.62,0 ; -7.12,0 -7.62,0 ; -4.31,0 -3.81,0 ; -3.81,-0.5 -3.81,0 ; -3.81,0.5 -3.81,0 ; -3.31,0 -3.81,0 ; -0.5,0 0,0 ; 0,-0.5 0,0 ; 0,0.5 0,0 ; 0.5,0 0,0 ; 7.12,0 7.62,0 ; 7.62,-0.5 7.62,0 ; 7.62,0.5 7.62,0 ; 8.12,0 7.62,0
Mechanical 14:
  lines w0.1: -10.145,1.6 -9.645,3 9.645,3 10.145,1.6 ; -10.145,1.6 -9.645,-2.21 9.645,-2.21 10.145,1.6 ; -10.145,1.6 10.145,1.6
3D body "IXYS_ISOPLUS264_V.stp": height 30, standoff -3.8, extent -10.145,-2.21 10.145,3

## IXYS_ISOPLUS i5-Pak_V [mm] "IXYS ISOPLUS i5-Pak Case, Lead spacing 3.81mm Body 20.29mm X 5.21mm - Vertical Mount"
height 30
pads (3):
  round 2.5 hole 1.8: 1(-7.62,0) 2(-3.81,0) 3(7.62,0)
Top Overlay:
  lines w0.2: -8.023,1.6 -10.145,1.6 ; -7.217,1.6 -4.213,1.6 ; -3.407,1.6 7.217,1.6 ; 8.023,1.6 10.145,1.6 ; -10.145,1.6 -9.645,3 9.645,3 10.145,1.6 ; -10.145,1.6 -9.645,-2.21 9.645,-2.21 10.145,1.6
Notvisible:
  circle w0.05: c7.62,0 r1.25
  circle w0.05: c7.62,0 r0.9
  circle w0.05: c-3.81,0 r1.25
  circle w0.05: c-3.81,0 r0.9
  circle w0.05: c-7.62,0 r1.25
  circle w0.05: c-7.62,0 r0.9
  lines w0.05: -8.12,0 -7.62,0 ; -7.62,-0.5 -7.62,0 ; -7.62,0.5 -7.62,0 ; -7.12,0 -7.62,0 ; -4.31,0 -3.81,0 ; -3.81,-0.5 -3.81,0 ; -3.81,0.5 -3.81,0 ; -3.31,0 -3.81,0 ; -0.5,0 0,0 ; 0,-0.5 0,0 ; 0,0.5 0,0 ; 0.5,0 0,0 ; 7.12,0 7.62,0 ; 7.62,-0.5 7.62,0 ; 7.62,0.5 7.62,0 ; 8.12,0 7.62,0
Mechanical 14:
  lines w0.1: -10.145,1.6 10.145,1.6 ; -10.145,1.6 -9.645,-2.21 9.645,-2.21 10.145,1.6 ; -10.145,1.6 -9.645,3 9.645,3 10.145,1.6
3D body "IXYS_ISOPLUS i5-Pak_V.stp": height 30, standoff -3.8, extent -10.145,-2.21 10.145,3

## IXYS_IXBOD 1-06..10 [mm] "Lead spacing 7.5mm Body 10mm X 4mm"
height 9
pads (2):
  round 1.9 hole 1.2: 1(-3.75,0) 2(3.75,0)
Top Overlay:
  lines w0.2: -4.816,1.5 4.816,1.5 ; -5,0 -4.693,2.5 4.693,2.5 5,0 4.816,-1.5 -4.816,-1.5 -5,0
Notvisible:
  lines w0.1: -4.25,0 -3.75,0 ; -3.75,-0.5 -3.75,0 ; -3.75,0.5 -3.75,0 ; -3.25,0 -3.75,0 ; -0.5,0 0,0 ; 0,-0.5 0,0 ; 0,0.5 0,0 ; 0.5,0 0,0 ; 3.25,0 3.75,0 ; 3.75,-0.5 3.75,0 ; 3.75,0.5 3.75,0 ; 4.25,0 3.75,0
Mechanical 14:
  lines w0.1: -4.816,1.5 4.816,1.5 ; -5,0 -4.693,2.5 4.693,2.5 5,0 4.816,-1.5 -4.816,-1.5 -5,0
3D body "IXYS_IXBOD 1-06..10.stp": height 9, standoff -4, extent -5,-1.5 5,2.5

## IXYS_IXBOD 1-12R..42 [mm] "Lead spacing 45.7mm Body 54.5mm X 7.5mm"
height 19
pads (2):
  round 1.9 hole 1.2: 1(-22.86,0) 2(22.86,0)
Top Overlay:
  lines w0.2: -24.75,-3.75 -24.75,3.75 ; -3.75,0 3.75,0 ; -0.866,0 0.866,-1 0.866,1 ; -27.25,-3.75 -27.25,3.75 27.25,3.75 27.25,-3.75 -27.25,-3.75
  text "A" at 17.175,-0.75 h1.5
  text "K" at -18.454,-0.75 h1.5
Notvisible:
  lines w0.1: -23.35,0 -22.85,0 ; -22.85,-0.5 -22.85,0 ; -22.85,0.5 -22.85,0 ; -22.35,0 -22.85,0 ; -0.5,0 0,0 ; 0,-0.5 0,0 ; 0,0.5 0,0 ; 0.5,0 0,0 ; 22.35,0 22.85,0 ; 22.85,-0.5 22.85,0 ; 22.85,0.5 22.85,0 ; 23.35,0 22.85,0
Mechanical 14:
  lines w0.1: -24.75,-3.75 -24.75,3.75 ; -3.75,0 3.75,0 ; -0.866,0 0.866,-1 0.866,1 ; -27.25,-3.75 -27.25,3.75 27.25,3.75 27.25,-3.75 -27.25,-3.75
  text "A" at 17.175,-0.75 h1.5
  text "K" at -18.454,-0.75 h1.5
3D body "IXYS_IXBOD 1-12..42.stp": height 19, standoff -3.1, extent -27.25,-3.75 27.25,3.75

## IXYS_PLUS247_FLIP [mm] "IXYS PLUS247 Case, Lead spacing 5.45mm Body 21.07mm X 15.94mm - Flipped Horizontal Mount"
height 5.21
pads (3):
  round 2.5 hole 1.8: 1(5.45,0) 2(0,0) 3(-5.45,0)
Top Overlay:
  lines w0.2: -7.62,7.545 -7.62,7.175 ; -7.62,8.545 -7.62,9.545 ; -7.62,10.545 -7.62,11.545 ; -7.62,12.545 -7.62,13.545 ; -7.62,14.545 -7.62,15.545 ; -7.62,16.545 -7.62,17.545 ; -7.62,18.545 -7.62,19.545 ; -7.62,20.545 -7.62,21.545 ; -7.62,22.545 -7.62,23.545 ; -7.62,24.545 -7.62,25.545 ; -7.62,26.545 -7.62,27.545 -6.62,27.545 ; -6.62,7.175 -7.62,7.175 ; -6.515,6.825 -6.515,2.505 -4.385,2.505 -4.385,6.825 ; -6.15,1.549 -6.15,2.505 ; -5.62,7.175 -4.62,7.175 ; -5.62,27.545 -4.62,27.545 ; -4.75,1.549 -4.75,2.505 ; -3.62,7.175 -2.62,7.175 ; -3.62,27.545 -2.62,27.545 ; -1.62,7.175 -0.62,7.175 ; -1.62,27.545 -0.62,27.545 ; -1.56,6.825 -1.56,2.505 1.56,2.505 1.56,6.825 ; -0.7,1.549 -0.7,2.505 ; 0.38,7.175 1.38,7.175 ; 0.38,27.545 1.38,27.545 ; 0.7,1.549 0.7,2.505 ; 2.38,7.175 3.38,7.175 ; 2.38,27.545 3.38,27.545 ; 4.38,7.175 5.38,7.175 ; 4.38,27.545 5.38,27.545 ; 4.385,6.825 4.385,2.505 6.515,2.505 6.515,6.825 ; 4.75,1.549 4.75,2.505 ; 6.15,1.549 6.15,2.505 ; 6.38,7.175 7.62,7.175 ; 6.38,27.545 7.62,27.545 ; 7.62,7.545 7.62,7.175 ; 7.62,8.545 7.62,9.545 ; 7.62,10.545 7.62,11.545 ; 7.62,12.545 7.62,13.545 ; 7.62,14.545 7.62,15.545 ; 7.62,16.545 7.62,17.545 ; 7.62,18.545 7.62,19.545 ; 7.62,20.545 7.62,21.545 ; 7.62,22.545 7.62,23.545 ; 7.62,24.545 7.62,25.545 ; 7.62,26.545 7.62,27.545 ; -7.97,6.825 -7.62,7.175 ; -7.97,6.825 -7.97,27.895 7.97,27.895 ; -7.97,6.825 7.97,6.825 ; 7.62,7.175 7.97,6.825 ; 7.62,27.545 7.97,27.895 ; 7.97,6.825 7.97,27.895 ; -6.7,9.525 6.7,9.525 6.7,25.025 4.7,26.025 -4.7,26.025 -6.7,25.025 -6.7,9.525
Notvisible:
  lines w0.1: -5.95,0 -5.45,0 ; -5.45,-0.5 -5.45,0 ; -5.45,0.5 -5.45,0 ; -4.95,0 -5.45,0 ; -0.5,0 0,0 ; -0.5,22 0,22 ; 0,-0.5 0,0 ; 0,0.5 0,0 ; 0,21.5 0,22 ; 0,22.5 0,22 ; 0.5,0 0,0 ; 0.5,22 0,22 ; 4.95,0 5.45,0 ; 5.45,-0.5 5.45,0 ; 5.45,0.5 5.45,0 ; 5.95,0 5.45,0
Mechanical 14:
  lines w0.1: -7.62,7.545 -7.62,7.175 ; -7.62,8.545 -7.62,9.545 ; -7.62,10.545 -7.62,11.545 ; -7.62,12.545 -7.62,13.545 ; -7.62,14.545 -7.62,15.545 ; -7.62,16.545 -7.62,17.545 ; -7.62,18.545 -7.62,19.545 ; -7.62,20.545 -7.62,21.545 ; -7.62,22.545 -7.62,23.545 ; -7.62,24.545 -7.62,25.545 ; -7.62,26.545 -7.62,27.545 -6.62,27.545 ; -6.62,7.175 -7.62,7.175 ; -6.515,6.825 -6.515,2.505 -4.385,2.505 -4.385,6.825 ; -6.15,2.505 -6.15,-0.4 -4.75,-0.4 -4.75,2.505 ; -5.62,7.175 -4.62,7.175 ; -5.62,27.545 -4.62,27.545 ; -3.62,7.175 -2.62,7.175 ; -3.62,27.545 -2.62,27.545 ; -1.62,7.175 -0.62,7.175 ; -1.62,27.545 -0.62,27.545 ; -1.56,6.825 -1.56,2.505 1.56,2.505 1.56,6.825 ; -0.7,2.505 -0.7,-0.4 0.7,-0.4 0.7,2.505 ; 0.38,7.175 1.38,7.175 ; 0.38,27.545 1.38,27.545 ; 2.38,7.175 3.38,7.175 ; 2.38,27.545 3.38,27.545 ; 4.38,7.175 5.38,7.175 ; 4.38,27.545 5.38,27.545 ; 4.385,6.825 4.385,2.505 6.515,2.505 6.515,6.825 ; 4.75,2.505 4.75,-0.4 6.15,-0.4 6.15,2.505 ; 6.38,7.175 7.62,7.175 ; 6.38,27.545 7.62,27.545 ; 7.62,7.545 7.62,7.175 ; 7.62,8.545 7.62,9.545 ; 7.62,10.545 7.62,11.545 ; 7.62,12.545 7.62,13.545 ; 7.62,14.545 7.62,15.545 ; 7.62,16.545 7.62,17.545 ; 7.62,18.545 7.62,19.545 ; 7.62,20.545 7.62,21.545 ; 7.62,22.545 7.62,23.545 ; 7.62,24.545 7.62,25.545 ; 7.62,26.545 7.62,27.545 ; -7.97,6.825 7.97,6.825 ; -7.97,6.825 -7.62,7.175 ; -7.97,6.825 -7.97,27.895 7.97,27.895 ; 7.62,7.175 7.97,6.825 ; 7.62,27.545 7.97,27.895 ; 7.97,6.825 7.97,27.895 ; -6.7,9.525 6.7,9.525 6.7,25.025 4.7,26.025 -4.7,26.025 -6.7,25.025 -6.7,9.525
3D body "IXYS_PLUS247_FLIP.stp": height 5.02, standoff -4.21, extent -7.97,-0.4 7.97,27.895

## IXYS_PLUS247_H [mm] "IXYS PLUS247 Case, Lead spacing 5.45mm Body 21.07mm X 15.94mm - Horizontal Mount"
height 5.21
pads (4):
  round 2.5 hole 1.8: 1(-5.45,0) 2(0,0) 3(5.45,0)
  rect 14.4x18.5 smd paste-9.25: 4(0,17.775)
Top Overlay:
  lines w0.2: -7.5,19.418 -7.62,19.403 ; -7.5,19.77 -7.97,19.713 -7.62,19.403 ; -7.5,24.23 -7.97,24.288 -7.62,24.597 ; -7.5,24.582 -7.62,24.597 ; -6.515,6.825 -7.97,6.825 ; -6.515,7.175 -6.515,2.505 -4.385,2.505 -4.385,7.175 ; -6.15,1.549 -6.15,2.505 ; -4.75,1.549 -4.75,2.505 ; -4.385,6.825 -1.56,6.825 ; -1.56,7.175 -1.56,2.505 1.56,2.505 1.56,7.175 ; -0.7,1.549 -0.7,2.505 ; 0.7,1.549 0.7,2.505 ; 1.56,6.825 4.385,6.825 ; 4.385,7.175 4.385,2.505 6.515,2.505 6.515,7.175 ; 4.75,1.549 4.75,2.505 ; 6.15,1.549 6.15,2.505 ; 6.515,6.825 7.97,6.825 ; 7.5,19.418 7.62,19.403 ; 7.5,19.77 7.97,19.713 7.62,19.403 ; 7.5,24.23 7.97,24.288 7.62,24.597 ; 7.5,24.582 7.62,24.597 ; -7.97,6.825 -7.97,27.895 7.97,27.895 ; -7.97,6.825 -7.62,7.175 ; -7.62,7.175 7.62,7.175 ; -7.62,7.175 -7.62,19.403 ; -7.62,24.597 -7.62,27.545 7.62,27.545 ; 7.62,7.175 7.97,6.825 ; 7.62,7.175 7.62,19.403 ; 7.62,24.597 7.62,27.545 ; 7.62,27.545 7.97,27.895 ; 7.97,6.825 7.97,27.895
Notvisible:
  lines w0.1: -5.95,0 -5.45,0 ; -5.45,-0.5 -5.45,0 ; -5.45,0.5 -5.45,0 ; -4.95,0 -5.45,0 ; -0.5,0 0,0 ; -0.5,17.36 0,17.36 ; -0.5,22 0,22 ; 0,-0.5 0,0 ; 0,0.5 0,0 ; 0,16.86 0,17.36 ; 0,21.5 0,22 ; 0,22.5 0,22 ; 0.5,0 0,0 ; 0.5,17.36 0,17.36 ; 0.5,22 0,22 ; 4.95,0 5.45,0 ; 5.45,-0.5 5.45,0 ; 5.45,0.5 5.45,0 ; 5.95,0 5.45,0 ; -7.2,8.525 0,17.775 ; -7.2,8.525 7.2,8.525 ; -7.2,8.525 -7.2,27.025 ; -7.2,27.025 0,17.775 ; -7.2,27.025 7.2,27.025 ; 0,17.775 7.2,27.025 ; 0,17.775 7.2,8.525 ; 7.2,8.525 7.2,27.025 ; -6.7,9.525 6.7,9.525 6.7,26.025 -6.7,26.025 -6.7,9.525
Mechanical 14:
  lines w0.1: -6.515,6.825 -7.97,6.825 ; -6.515,7.175 -6.515,2.505 -4.385,2.505 -4.385,7.175 ; -6.15,2.505 -6.15,-0.4 -4.75,-0.4 -4.75,2.505 ; -4.385,6.825 -1.56,6.825 ; -1.56,7.175 -1.56,2.505 1.56,2.505 1.56,7.175 ; -0.7,2.505 -0.7,-0.4 0.7,-0.4 0.7,2.505 ; 1.56,6.825 4.385,6.825 ; 4.385,7.175 4.385,2.505 6.515,2.505 6.515,7.175 ; 4.75,2.505 4.75,-0.4 6.15,-0.4 6.15,2.505 ; 6.515,6.825 7.97,6.825 ; -7.97,6.825 -7.97,27.895 7.97,27.895 ; -7.97,6.825 -7.62,7.175 ; -7.62,7.175 7.62,7.175 ; -7.62,7.175 -7.62,19.403 ; -7.62,19.403 -6.12,19.587 ; -7.62,19.403 -7.97,19.713 -6.47,19.897 ; -7.62,24.597 -7.62,27.545 7.62,27.545 ; -7.62,24.597 -7.97,24.288 -6.47,24.103 ; -7.62,24.597 -6.12,24.413 ; -6.47,19.897 -6.47,24.103 ; -6.47,19.897 -6.12,19.587 ; -6.47,24.103 -6.12,24.413 ; -6.12,19.587 -6.12,24.413 ; 6.12,19.587 7.62,19.403 ; 6.12,19.587 6.47,19.897 ; 6.12,19.587 6.12,24.413 ; 6.12,24.413 6.47,24.103 ; 6.12,24.413 7.62,24.597 ; 6.47,19.897 6.47,24.103 ; 6.47,19.897 7.97,19.713 7.62,19.403 ; 6.47,24.103 7.97,24.288 7.62,24.597 ; 7.62,7.175 7.97,6.825 ; 7.62,7.175 7.62,19.403 ; 7.62,24.597 7.62,27.545 ; 7.62,27.545 7.97,27.895 ; 7.97,6.825 7.97,27.895
3D body "IXYS_PLUS247_H.stp": height 5.02, standoff -3.6, extent -7.97,-0.4 7.97,27.895

## IXYS_PLUS247_V [mm] "IXYS PLUS247 Case, Lead spacing 5.45mm Body 21.07mm X 15.94mm - Vertical Mount"
height 25.66
pads (3):
  round 2.5 hole 1.8: 1(-5.45,0) 2(0,0) 3(5.45,0)
Top Overlay:
  lines w0.2: -6.964,0.655 -7.97,0.655 ; -3.936,0.655 -1.795,0.655 ; 1.795,0.655 3.936,0.655 ; 6.964,0.655 7.97,0.655 ; -7.97,0.655 -7.97,2.815 7.97,2.815 7.97,0.655 ; -7.97,0.655 -7.62,-2.205 7.623,-2.205 7.97,0.655
Notvisible:
  lines w0.1: -5.95,0 -5.45,0 ; -5.45,-0.5 -5.45,0 ; -5.45,0.5 -5.45,0 ; -4.95,0 -5.45,0 ; -0.5,0 0,0 ; 0,-0.5 0,0 ; 0,0.5 0,0 ; 0.5,0 0,0 ; 4.95,0 5.45,0 ; 5.45,-0.5 5.45,0 ; 5.45,0.5 5.45,0 ; 5.95,0 5.45,0
Mechanical 14:
  lines w0.1: 7.62,-2.205 7.97,0.655 ; 7.623,-2.205 -7.62,-2.205 -7.97,0.655 ; -7.97,0.655 7.97,0.655 ; -7.97,0.655 -7.97,2.815 7.97,2.815 7.97,0.655
3D body "IXYS_PLUS247_V.stp": height 25.4, standoff -4.95, extent -7.97,-2.205 7.97,2.815